# Altium footprint library StandardCase.PcbLib: 206 footprints (part 8 of 13)
Each footprint in its own frame and in the unit in brackets; x right, y up, seen from the top. Pads: shape width x height; smd on the part's side, far side on the other; paste and mask are expansions set on the pad; w line width, h text height; cw(c..) or ccw(c..) is an arc to the next point about the centre after c.
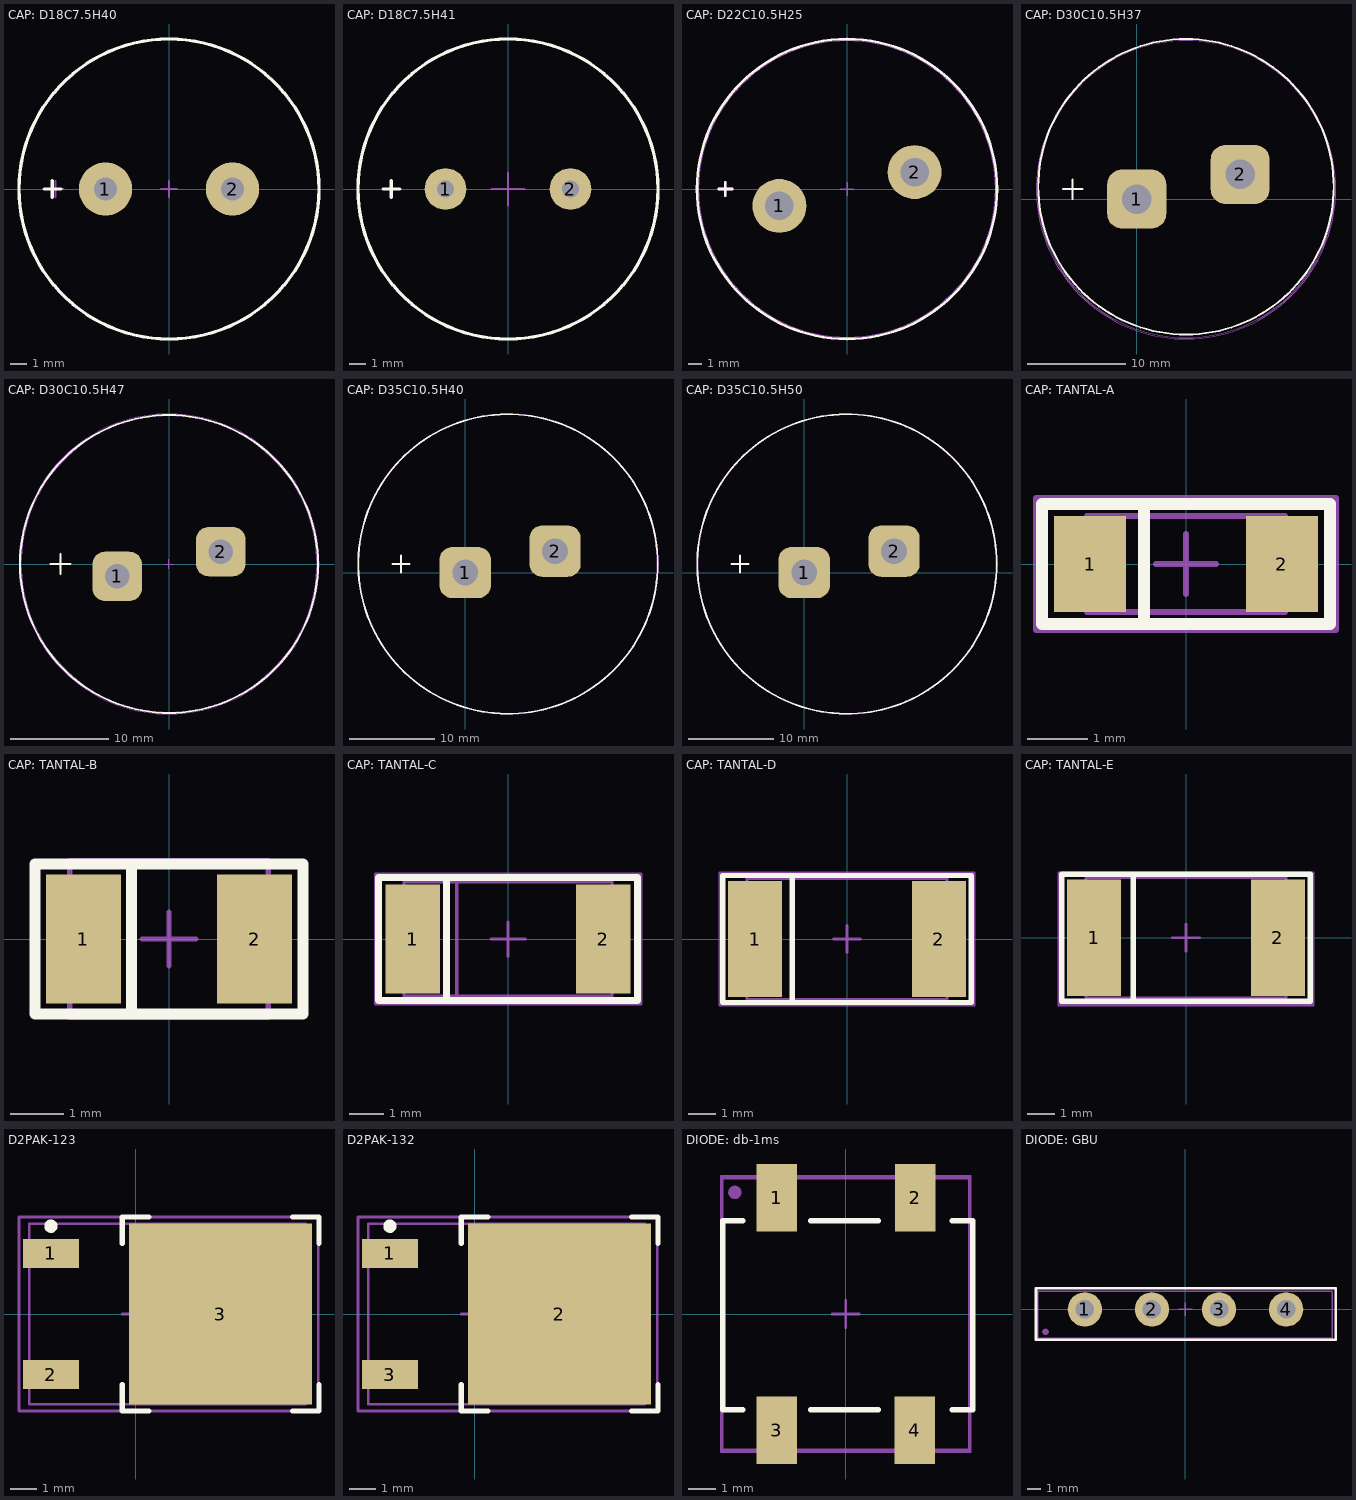
[diagram p7: the footprints below, top view; thin cyan lines are the x and y axes]

## CAP: D18C7.5H40 [mm]
height 40
pads (2):
  round 3.2 hole 1.4: 1(-3.81,0) 2(3.81,0)
Top Overlay:
  circle w0.2: c0,0 r9
  lines w0.2: -7.5,0 -6.5,0 ; -7,-0.5 -7,0.5
Mechanical 1:
  circle w0.1: c0,0 r9
  lines w0.1: -7.31,0 -6.31,0 ; -6.81,-0.5 -6.81,0.5
Mechanical 15:
  circle w0.1: c0,0 r9
  lines w0.1: -0.5,0 0.5,0 ; 0,-0.5 0,0.5
3D body "User Library-Cap-EL(18x40-7_5)T.STEP": height 41, standoff -3, extent -9,-8.999 9.002,9

## CAP: D18C7.5H41 [mm]
height 31.5
pads (2):
  round 2.5 hole 1: 1(-3.75,0) 2(3.75,0)
Top Overlay:
  circle w0.2: c0,0 r9
  lines w0.2: -7.5,0 -6.5,0 ; -7,-0.5 -7,0.5
Mechanical 1:
  circle w0.1: c0,0 r9
Mechanical 15:
  circle w0.1: c0,0 r9
  lines w0.1: -1,0 1,0 ; 0,-1 0,1
3D body "Cap electrolitic radial 18x41.STEP": height 41.3, standoff -1.2, extent -8.997,-8.999 8.997,9

## CAP: D22C10.5H25 [mm]
height 25
pads (2):
  round 4 hole 2.1: 1(-5,-1.25) 2(5,1.25)
Top Overlay:
  circle w0.2: c0,0 r11.1
  lines w0.2: -9.5,0 -8.5,0 ; -9,-0.5 -9,0.5
Mechanical 1:
  circle w0.1: c0,0 r11
  lines w0.2: -9.5,0 -8.5,0 ; -9,-0.5 -9,0.5
Mechanical 15:
  circle w0.1: c0,0 r11
  lines w0.1: -0.5,0 0.5,0 ; 0,-0.5 0,0.5
3D body "User Library-ECEC2DP271BJ.STEP": height 25, standoff 0, extent -11,-11 11,11

## CAP: D30C10.5H37 [mm]
height 37
pads (2):
  rrect50% 6x6 hole 3: 1(0,0) 2(10.5,2.5)
Top Overlay:
  circle w0.2: c5,1.25 r15
  lines w0.2: -7.5,1 -5.5,1 ; -6.5,0 -6.5,2
Mechanical 1:
  circle w0.1: c5,1 r15.207
  lines w0.1: -7.5,1 -5.5,1 ; -6.5,0 -6.5,2
Mechanical 15:
  circle w0.1: c5,1 r15.075
3D body "User Library-Assy_CE_R400_D1200_H1450.STEP": height 36.83, standoff -6.89, extent -12.7,-16.473 22.61,18.836

## CAP: D30C10.5H47 [mm]
height 37
pads (2):
  rrect50% 5x5 hole 2.5: 1(-5.25,-1.25) 2(5.25,1.25)
Top Overlay:
  circle w0.2: c0,0 r15.1
  lines w0.2: -12,0 -10,0 ; -11,-1 -11,1
Mechanical 1:
  circle w0.1: c0,0 r15
  lines w0.1: -11.5,0 -10.5,0 ; -11,-0.5 -11,0.5
Mechanical 15:
  circle w0.1: c0,0 r15.2
  lines w0.1: -0.5,0 0.5,0 ; 0,-0.5 0,0.5
3D body "Capacitor D30C10H47.STEP": height 47, standoff 0, extent -15,-15 15,15

## CAP: D35C10.5H40 [mm]
height 50
pads (2):
  rrect50% 6x6 hole 3: 1(0,0) 2(10.5,2.5)
Top Overlay:
  circle w0.2: c5,1 r17.5
  lines w0.2: -8.5,1 -6.5,1 ; -7.5,0 -7.5,2
Mechanical 1:
  circle w0.1: c5,1 r17.464
  lines w0.1: -8.5,1 -6.5,1 ; -7.5,0 -7.5,2
Mechanical 15:
  circle w0.1: c5,1 r17.529
3D body "Capacitor D35H40.STEP": height 40, standoff 0, extent -13,-17 23,19

## CAP: D35C10.5H50 [mm]
height 50
pads (2):
  rrect50% 6x6 hole 3: 1(0,0) 2(10.5,2.5)
Top Overlay:
  circle w0.2: c5,1 r17.5
  lines w0.2: -8.5,1 -6.5,1 ; -7.5,0 -7.5,2
Mechanical 1:
  circle w0.1: c5,1 r17.464
  lines w0.1: -8.5,1 -6.5,1 ; -7.5,0 -7.5,2
Mechanical 15:
  circle w0.1: c5,1 r17.529
3D body "User Library-el_cap_470uF-400V.STEP": height 46.7, standoff -3.5, extent -15.756,-19.756 25.756,21.756

## CAP: TANTAL-A [mm]
height 1.6
pads (2):
  rect 1.2x1.6 smd: 1(-1.6,0) 2(1.6,0)
Top Overlay:
  lines w0.2: -0.7,-1 -0.7,1 ; -2.4,-1 2.4,-1 2.4,1 -2.4,1 -2.4,-1
Mechanical 1:
  lines w0.1: -0.7,-0.8 -0.7,0.8 ; -1.651,-0.8 1.651,-0.8 1.651,0.8 -1.651,0.8 -1.651,-0.8
Mechanical 15:
  lines w0.1: -0.5,0 0.5,0 ; 0,-0.5 0,0.5 ; -2.5,-1.1 -2.5,1.1 2.5,1.1 2.5,-1.1 -2.5,-1.1
3D body "User Library-AVX_ACASE.STEP": height 1.71, standoff 0, extent -1.7,-0.84 1.7,0.84

## CAP: TANTAL-B [mm]
height 1.9
pads (2):
  rect 1.4x2.4 smd: 1(-1.6,0) 2(1.6,0)
Top Overlay:
  lines w0.2: -0.7,-1.4 -0.7,1.3 ; -2.5,-1.4 -2.5,1.4 2.5,1.4 2.5,-1.4 -2.5,-1.4
Mechanical 1:
  lines w0.1: -0.7,-1.465 -0.7,1.465 ; -1.85,-1.465 -1.85,1.465 1.85,1.465 1.85,-1.465 -1.85,-1.465
Mechanical 15:
  lines w0.1: -0.5,0 0.5,0 ; 0,-0.5 0,0.5 ; -2.5,-1.4 2.5,-1.4 2.5,1.4 -2.5,1.4 -2.5,-1.4
3D body "User Library-AVX_BCASE.STEP": height 2.03, standoff 0, extent -1.85,-1.465 1.85,1.465

## CAP: TANTAL-C [mm]
height 2.5
pads (2):
  rect 1.6x3.2 smd: 1(-2.8,0) 2(2.8,0)
Top Overlay:
  lines w0.2: -1.8,-1.8 -1.8,1.8 ; -3.8,-1.8 3.8,-1.8 3.8,1.8 -3.8,1.8 -3.8,-1.8
Mechanical 1:
  lines w0.1: -1.5,-1.675 -1.5,1.675 ; -3.05,-1.675 -3.05,1.675 3.05,1.675 3.05,-1.675 -3.05,-1.675
Mechanical 15:
  lines w0.1: -0.5,0 0.5,0 ; 0,-0.5 0,0.5 ; -3.875,-1.9 -3.875,1.9 3.9,1.9 3.9,-1.9 -3.875,-1.9
3D body "User Library-AVX_C_CASE.STEP": height 2.7, standoff 0, extent -3.05,-1.675 3.05,1.675

## CAP: TANTAL-D [mm]
height 2.9
pads (2):
  rect 2x4.3 smd: 1(-3.4,0) 2(3.4,0)
Top Overlay:
  lines w0.2: -2.025,-2.35 -2.025,2.35 ; -4.6,-2.35 4.6,-2.35 4.6,2.35 -4.6,2.35 -4.6,-2.35
Mechanical 1:
  lines w0.1: -2.025,-2.225 -2.025,2.225 ; -3.7,-2.225 -3.7,2.225 3.7,2.225 3.7,-2.225 -3.7,-2.225
Mechanical 15:
  lines w0.1: -0.5,0 0.5,0 ; 0,-0.5 0,0.5 ; -4.7,-2.45 -4.7,2.45 4.7,2.45 4.7,-2.45 -4.7,-2.45
3D body "User Library-AVX_D_CASE.STEP": height 3.01, standoff 0, extent -3.7,-2.225 3.7,2.225

## CAP: TANTAL-E [mm]
height 2.9
pads (2):
  rect 2x4.3 smd: 1(-3.4,0) 2(3.4,0)
Top Overlay:
  lines w0.2: -1.95,-2.325 -1.95,2.325 ; -4.6,-2.35 4.6,-2.35 4.6,2.35 -4.6,2.35 -4.6,-2.35
Mechanical 1:
  lines w0.1: -1.95,-2.225 -1.95,2.225 ; -3.7,-2.225 3.7,-2.225 3.7,2.225 -3.7,2.225 -3.7,-2.225
Mechanical 15:
  lines w0.1: -0.5,0 0.5,0 ; 0,-0.5 0,0.5 ; -4.7,-2.5 -4.7,2.4 4.7,2.4 4.7,-2.5 -4.7,-2.5
3D body "User Library-AVX_E_CASE.STEP": height 4.2, standoff 0, extent -3.7,-2.225 3.7,2.225

## D2PAK-123 [mm]
height 2.38
pads (3):
  rect 2.1x1.1 smd: 1(-3.191,2.28) 2(-3.191,-2.28)
  rect 6.9x6.8 smd: 3(3.191,0)
Top Overlay:
  circle w0.25: c-3.191,3.305 r0.125
  lines w0.2: -0.5,-2.65 -0.5,-3.65 0.5,-3.65 ; -0.5,2.65 -0.5,3.65 0.5,3.65 ; 5.9,-3.65 6.9,-3.65 6.9,-2.65 ; 5.9,3.65 6.9,3.65 6.9,2.65
Mechanical 1:
  lines w0.1: -4,-3.4 -4,3.4 6.4,3.4 6.4,-3.4 -4,-3.4
Mechanical 15:
  lines w0.1: -0.5,0 0.5,0 ; 0,-0.5 0,0.5 ; -4.391,-3.65 -4.391,3.65 6.874,3.65 6.874,-3.65 -4.391,-3.65
3D body "D2PAK.step": height 2.39, standoff 0, extent -4.019,-3.365 6.428,3.365

## D2PAK-132 [mm]
height 2.38
pads (3):
  rect 2.1x1.1 smd: 1(-3.191,2.28) 3(-3.191,-2.28)
  rect 6.9x6.8 smd: 2(3.191,0)
Top Overlay:
  circle w0.25: c-3.191,3.305 r0.125
  lines w0.2: -0.5,-2.65 -0.5,-3.65 0.5,-3.65 ; -0.5,2.65 -0.5,3.65 0.5,3.65 ; 5.9,-3.65 6.9,-3.65 6.9,-2.65 ; 5.9,3.65 6.9,3.65 6.9,2.65
Mechanical 1:
  lines w0.1: -4,-3.4 6.4,-3.4 6.4,3.4 -4,3.4 -4,-3.4
Mechanical 15:
  lines w0.1: -0.5,0 0.5,0 ; 0,-0.5 0,0.5 ; -4.391,-3.65 6.874,-3.65 6.874,3.65 -4.391,3.65 -4.391,-3.65
3D body "D2PAK.step": height 2.39, standoff 0, extent -4.019,-3.365 6.428,3.365

## DIODE: db-1ms [mm]
pads (5):
  rect 1.5x2.5 smd: 1(-2.55,4.3) 2(2.575,4.3) 3(-2.55,-4.3) 4(2.55,-4.3)
  round 0.5 on Mech1: ""(-4.1,4.5)
Top Overlay:
  lines w0.2: -3.8,-3.55 -4.55,-3.55 -4.55,3.45 -3.8,3.45 ; -1.3,-3.55 1.2,-3.55 ; -1.3,3.45 1.2,3.45 ; 3.95,-3.55 4.7,-3.55 4.7,3.45 3.95,3.45
Mechanical 1:
  lines w0.1: -4.575,-5.025 -4.575,5.025 4.575,5.025 4.575,-5.025 -4.575,-5.025
Mechanical 15:
  lines w0.1: -0.5,0 0,0 0.5,0 ; 0,-0.5 0,0.5 ; -4.6,-5.1 4.6,-5.1 4.6,5.1 -4.6,5.1 -4.6,-5.1
3D body "User Library-DB-1S.STEP": height 3.4, standoff 0, extent -4.575,-5.025 4.575,5.025

## DIODE: GBU [mm]
pads (5):
  round 2.6 hole 1.4: 1(-7.62,0) 2(-2.54,0) 3(2.54,0) 4(7.62,0)
  round 0.5 on Mech1: 2(-10.6,-1.7)
Top Overlay:
  lines w0.2: -11.32,-2.3 11.38,-2.3 11.38,1.6 -11.32,1.6 -11.32,-2.3
Mechanical 1:
  lines w0.1: -11.17,-2.2 11.13,-2.2 11.13,1.36 -11.17,1.36 -11.17,-2.2
Mechanical 15:
  lines w0.1: -0.5,0 0.5,0 ; 0,-0.5 0,0.5 ; -11.3,-2.3 11.4,-2.3 11.4,1.6 -11.3,1.6 -11.3,-2.3
3D body "User Library-GBU Vishay.STEP": height 25, standoff -11.55, extent -11.17,-2.2 11.13,1.36